# Altium schematic symbol library Diode - Rectifier.SchLib: 777 symbols (part 1 of 4) (continued)
## BAT42W-TP (continued)
DIODE SCHOTTKY 30V 200MA SOD123; Manufacturer: Micro Commercial Co; Current Reverse Leakage @ Vr: 500nA @ 25V; Reverse Recovery Time (trr): 5ns; Current Rectified: 200mA (DC); Voltage Forward (Vf): 1V @ 200mA; Part Number: BAT42W-TP; PartId: 29384; Supplier 1: Digi-Key; Supplier Part Number 1: BAT42WTPMSCT-ND; ComponentLink1Description: Datasheet; ComponentLink1URL: http://www.mccsemi.com/up_pdf/BAT42W-BAT43W(SOD-123).pdf; ComponentLink2Description: Digi-Key Listing; ComponentLink2URL: https://www.digikey.com/product-detail/en/micro-commercial-co/BAT42W-TP/BAT42WTPMSCT-ND/717337; Junction Operating Temperature: -55C ~ 125C; Price: 0.4; Type: Schottky; Device Package: SOD-123; Voltage DC Reverse (Vr): 30V
footprint SOD-123
pins: 1, 2

## BAT43W-7-F
designator D?
DIODE SCHOTTKY 30V 200MA SOD123; Manufacturer: Diodes Incorporated; Current Reverse Leakage @ Vr: 500nA @ 25V; Reverse Recovery Time (trr): 5ns; Current Rectified: 200mA (DC); Voltage Forward (Vf): 1V @ 200mA; Part Number: BAT43W-7-F; PartId: 14612; Supplier 1: Digi-Key; Supplier Part Number 1: BAT43W-FDITR-ND; ComponentLink1Description: Datasheet; ComponentLink1URL: //media.digikey.com/pdf/Data%20Sheets/Diodes%20PDFs/BAT42W%20-BAT43W.pdf; ComponentLink2Description: Digi-Key Listing; ComponentLink2URL: https://www.digikey.com/product-detail/en/diodes-incorporated/BAT43W-7-F/BAT43W-FDITR-ND/749953; Junction Operating Temperature: -55C ~ 125C; Price: 0.085; Type: Schottky; Device Package: SOD-123; Voltage DC Reverse (Vr): 30V
footprint SOD-123
pins: 1, 2

## BAT43W-TP
designator D?
DIODE SCHOTTKY 30V 200MA SOD123; Manufacturer: Micro Commercial Co; Current Reverse Leakage @ Vr: 500nA @ 25V; Reverse Recovery Time (trr): 5ns; Current Rectified: 200mA (DC); Voltage Forward (Vf): 1V @ 200mA; Part Number: BAT43W-TP; PartId: 29385; Supplier 1: Digi-Key; Supplier Part Number 1: BAT43WTPMSCT-ND; ComponentLink1Description: Datasheet; ComponentLink1URL: http://www.mccsemi.com/up_pdf/BAT42W-BAT43W(SOD-123).pdf; ComponentLink2Description: Digi-Key Listing; ComponentLink2URL: https://www.digikey.com/product-detail/en/micro-commercial-co/BAT43W-TP/BAT43WTPMSCT-ND/717339; Junction Operating Temperature: -55C ~ 125C; Price: 0.4; Type: Schottky; Device Package: SOD-123; Voltage DC Reverse (Vr): 30V
footprint SOD-123
pins: 1, 2

## BAT46W-7-F
designator D?
DIODE SCHOTTKY 100V 150MA SOD123; Manufacturer: Diodes Incorporated; Current Reverse Leakage @ Vr: 2uA @ 75V; Current Rectified: 150mA (DC); Voltage Forward (Vf): 450mV @ 10mA; Part Number: BAT46W-7-F; PartId: 14606; Supplier 1: Digi-Key; Supplier Part Number 1: BAT46W-7FDITR-ND; ComponentLink1Description: Datasheet; ComponentLink1URL: http://www.diodes.com/_files/datasheets/ds30044.pdf; ComponentLink2Description: Digi-Key Listing; ComponentLink2URL: https://www.digikey.com/product-detail/en/diodes-incorporated/BAT46W-7-F/BAT46W-7FDITR-ND/1934440; Junction Operating Temperature: -55C ~ 125C; Price: 0.081; Type: Schottky; Device Package: SOD-123; Voltage DC Reverse (Vr): 100V
footprint SOD-123
pins: 1, 2

## BAT46W-E3-08
designator D?
DIODE SCHOTTKY 100V 150MA SOD123; Manufacturer: Vishay Semiconductor Diodes Division; Current Reverse Leakage @ Vr: 5uA @ 75V; Current Rectified: 150mA (DC); Voltage Forward (Vf): 1V @ 250mA; Part Number: BAT46W-E3-08; PartId: 29348; Supplier 1: Digi-Key; Supplier Part Number 1: BAT46W-E3-08CT-ND; ComponentLink1Description: Datasheet; ComponentLink1URL: http://www.vishay.com/docs/85663/bat46wv.pdf; ComponentLink2Description: Digi-Key Listing; ComponentLink2URL: https://www.digikey.com/product-detail/en/vishay-semiconductor-diodes-division/BAT46W-E3-08/BAT46W-E3-08CT-ND/3104420; Junction Operating Temperature: 125C (Max); Price: 0.39; Type: Schottky; Device Package: SOD-123; Voltage DC Reverse (Vr): 100V
footprint SOD-123
pins: 1, 2

## BAT46W-E3-18
designator D?
DIODE SCHOTTKY 100V 150MA SOD123; Manufacturer: Vishay Semiconductor Diodes Division; Current Reverse Leakage @ Vr: 5uA @ 75V; Current Rectified: 150mA (DC); Voltage Forward (Vf): 1V @ 250mA; Part Number: BAT46W-E3-18; PartId: 29407; Supplier 1: Digi-Key; Supplier Part Number 1: BAT46W-E3-18GICT-ND; ComponentLink1Description: Datasheet; ComponentLink1URL: http://www.vishay.com/docs/85663/bat46wv.pdf; ComponentLink2Description: Digi-Key Listing; ComponentLink2URL: https://www.digikey.com/product-detail/en/vishay-semiconductor-diodes-division/BAT46W-E3-18/BAT46W-E3-18GICT-ND/6228425; Junction Operating Temperature: 125C (Max); Price: 0.39; Type: Schottky; Device Package: SOD-123; Voltage DC Reverse (Vr): 100V
footprint SOD-123
pins: 1, 2

## BAT46W-HE3-08
designator D?
DIODE SCHOTTKY 100V 150MA SOD123; Manufacturer: Vishay Semiconductor Diodes Division; Current Reverse Leakage @ Vr: 5uA @ 75V; Current Rectified: 150mA (DC); Voltage Forward (Vf): 1V @ 250mA; Part Number: BAT46W-HE3-08; PartId: 29409; Supplier 1: Digi-Key; Supplier Part Number 1: BAT46W-HE3-08GICT-ND; ComponentLink1Description: Datasheet; ComponentLink1URL: http://www.vishay.com/docs/85663/bat46wv.pdf; ComponentLink2Description: Digi-Key Listing; ComponentLink2URL: https://www.digikey.com/product-detail/en/vishay-semiconductor-diodes-division/BAT46W-HE3-08/BAT46W-HE3-08GICT-ND/6228455; Junction Operating Temperature: 125C (Max); Price: 0.41; Type: Schottky; Device Package: SOD-123; Voltage DC Reverse (Vr): 100V
footprint SOD-123
pins: 1, 2

## BAT46W-TP
designator D?
DIODE SCHOTTKY 100V 75MA SOD123; Manufacturer: Micro Commercial Co; Current Reverse Leakage @ Vr: 5uA @ 75V; Voltage Forward (Vf): 450mV @ 10mA; Part Number: BAT46W-TP; PartId: 29387; Supplier 1: Digi-Key; Supplier Part Number 1: BAT46W-TPMSCT-ND; ComponentLink1Description: Datasheet; ComponentLink1URL: http://www.mccsemi.com/up_pdf/BAT46W(SOD-123).pdf; ComponentLink2Description: Digi-Key Listing; ComponentLink2URL: https://www.digikey.com/product-detail/en/micro-commercial-co/BAT46W-TP/BAT46W-TPMSCT-ND/2345686; Junction Operating Temperature: -55C ~ 125C; Price: 0.4; Type: Schottky; Device Package: SOD-123; Voltage DC Reverse (Vr): 100V; Current Rectified: 75mA
footprint SOD-123
pins: 1, 2

## BAT46WH,115
designator D?
DIODE SCHOTTKY 100V 250MA; Manufacturer: NXP USA Inc.; Current Reverse Leakage @ Vr: 9uA @ 100V; Reverse Recovery Time (trr): 5.9ns; Current Rectified: 250mA (DC); Voltage Forward (Vf): 850mV @ 250mA; Part Number: BAT46WH,115; PartId: 29189; Supplier 1: Digi-Key; Supplier Part Number 1: 568-6016-1-ND; ComponentLink1Description: Datasheet; ComponentLink1URL: http://www.nxp.com/documents/data_sheet/BAT46WH.pdf; ComponentLink2Description: Digi-Key Listing; ComponentLink2URL: https://www.digikey.com/product-detail/en/nxp-usa-inc/BAT46WH,115/568-6016-1-ND/2531303; Junction Operating Temperature: 150C (Max); Price: 0.38; Type: Schottky; Device Package: SOD-123F; Voltage DC Reverse (Vr): 100V
footprint SOD123F
pins: 1, 2

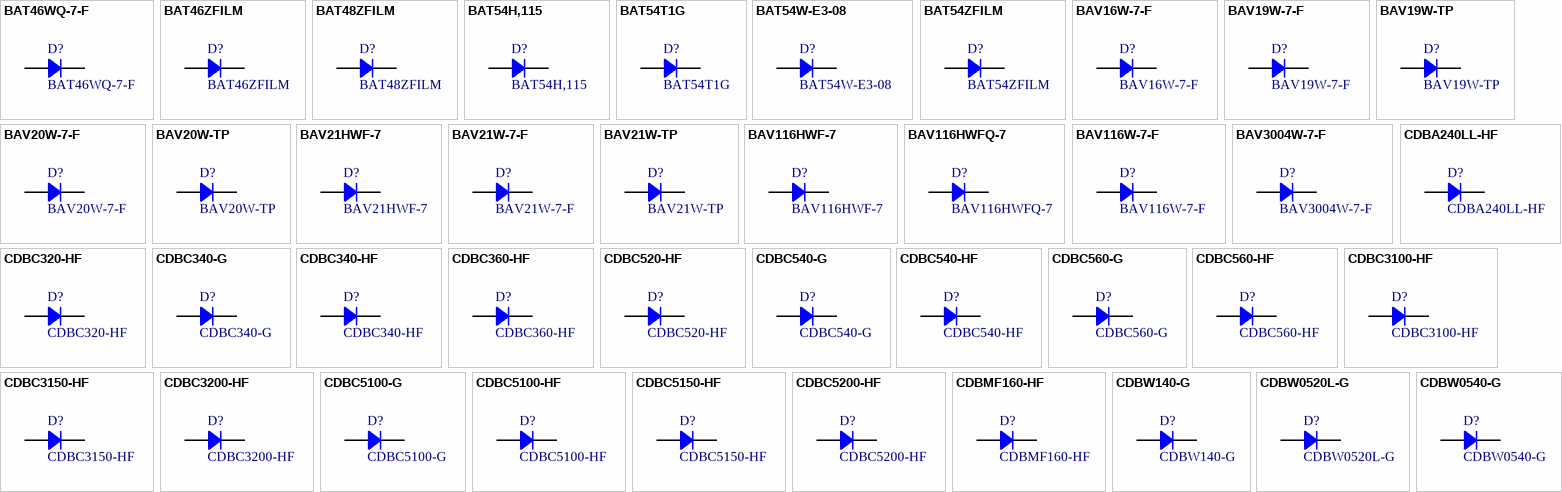
[diagram p3: symbols BAT46WQ-7-F to CDBW0540-G]

## BAT46WQ-7-F
designator D?
DIODE SCHOTTKY 100V SOD123; Manufacturer: Diodes Incorporated; Current Reverse Leakage @ Vr: 2uA @ 75V; Current Rectified: 150mA; Voltage Forward (Vf): 450mV @ 10mA; Part Number: BAT46WQ-7-F; PartId: 29436; Supplier 1: Digi-Key; Supplier Part Number 1: BAT46WQ-7-FDICT-ND; ComponentLink1Description: Datasheet; ComponentLink1URL: http://www.diodes.com/_files/datasheets/BAT46WQ.pdf; ComponentLink2Description: Digi-Key Listing; ComponentLink2URL: https://www.digikey.com/product-detail/en/diodes-incorporated/BAT46WQ-7-F/BAT46WQ-7-FDICT-ND/6003951; Junction Operating Temperature: -55C ~ 125C; Price: 0.37; Type: Schottky; Device Package: SOD-123; Voltage DC Reverse (Vr): 100V
footprint SOD-123
pins: 1, 2

## BAT46ZFILM
designator D?
DIODE SCHOTTKY 100V 150MA SOD123; Manufacturer: STMicroelectronics; Current Reverse Leakage @ Vr: 5uA @ 75V; Current Rectified: 150mA (DC); Voltage Forward (Vf): 1V @ 250mA; Part Number: BAT46ZFILM; PartId: 29342; Supplier 1: Digi-Key; Supplier Part Number 1: 497-5559-1-ND; ComponentLink1Description: Datasheet; ComponentLink1URL: http://www.st.com/content/ccc/resource/technical/document/datasheet/c6/32/d4/4a/28/d3/4b/11/CD00004930.pdf/files/CD00004930.pdf/jcr:content/translations/en.CD00004930.pdf; ComponentLink2Description: Digi-Key Listing; ComponentLink2URL: https://www.digikey.com/product-detail/en/stmicroelectronics/BAT46ZFILM/497-5559-1-ND/1207051; Junction Operating Temperature: 150C (Max); Price: 0.34; Type: Schottky; Device Package: SOD-123; Voltage DC Reverse (Vr): 100V
footprint SOD-123
pins: 1, 2

## BAT48ZFILM
designator D?
DIODE SCHOTTKY 40V 350MA SOD123; Manufacturer: STMicroelectronics; Current Reverse Leakage @ Vr: 25uA @ 40V; Current Rectified: 350mA (DC); Voltage Forward (Vf): 750mV @ 200mA; Part Number: BAT48ZFILM; PartId: 29394; Supplier 1: Digi-Key; Supplier Part Number 1: 497-5712-1-ND; ComponentLink1Description: Datasheet; ComponentLink1URL: http://www.st.com/content/ccc/resource/technical/document/datasheet/b2/2f/2a/0c/8b/b5/46/a3/CD00130229.pdf/files/CD00130229.pdf/jcr:content/translations/en.CD00130229.pdf; ComponentLink2Description: Digi-Key Listing; ComponentLink2URL: https://www.digikey.com/product-detail/en/stmicroelectronics/BAT48ZFILM/497-5712-1-ND/1299965; Junction Operating Temperature: -40C ~ 150C; Price: 0.43; Type: Schottky; Device Package: SOD-123; Voltage DC Reverse (Vr): 40V
footprint SOD-123
pins: 1, 2

## BAT54H,115
designator D?
DIODE SCHOTTKY 30V 200MA SOD123F; Manufacturer: NXP USA Inc.; Current Reverse Leakage @ Vr: 2uA @ 25V; Current Rectified: 200mA (DC); Voltage Forward (Vf): 800mV @ 100mA; Part Number: BAT54H,115; PartId: 29185; Supplier 1: Digi-Key; Supplier Part Number 1: 568-3415-1-ND; ComponentLink1Description: Datasheet; ComponentLink1URL: http://www.nxp.com/documents/data_sheet/BAT54H.pdf; ComponentLink2Description: Digi-Key Listing; ComponentLink2URL: https://www.digikey.com/product-detail/en/nxp-usa-inc/BAT54H,115/568-3415-1-ND/1127204; Junction Operating Temperature: 125C (Max); Price: 0.33; Type: Schottky; Device Package: SOD-123F; Voltage DC Reverse (Vr): 30V
footprint SOD123F
pins: 1, 2

## BAT54T1G
designator D?
DIODE SCHOTTKY 30V 200MA SOD123; Manufacturer: ON Semiconductor; Current Reverse Leakage @ Vr: 2uA @ 25V; Reverse Recovery Time (trr): 5ns; Current Rectified: 200mA (DC); Voltage Forward (Vf): 800mV @ 100mA; Part Number: BAT54T1G; PartId: 29374; Supplier 1: Digi-Key; Supplier Part Number 1: BAT54T1GOSCT-ND; ComponentLink1Description: Datasheet; ComponentLink1URL: http://www.onsemi.com/pub_link/Collateral/BAT54T1-D.PDF; ComponentLink2Description: Digi-Key Listing; ComponentLink2URL: https://www.digikey.com/product-detail/en/on-semiconductor/BAT54T1G/BAT54T1GOSCT-ND/917813; Junction Operating Temperature: -55C ~ 125C; Price: 0.34; Type: Schottky; Device Package: SOD-123; Voltage DC Reverse (Vr): 30V
footprint SOD-123
pins: 1, 2

## BAT54W-E3-08
designator D?
DIODE SCHOTTKY 30V 200MA SOD123; Manufacturer: Vishay Semiconductor Diodes Division; Current Reverse Leakage @ Vr: 2uA @ 25V; Reverse Recovery Time (trr): 5ns; Current Rectified: 200mA (DC); Voltage Forward (Vf): 800mV @ 100mA; Part Number: BAT54W-E3-08; PartId: 29386; Supplier 1: Digi-Key; Supplier Part Number 1: BAT54W-E3-08CT-ND; ComponentLink1Description: Datasheet; ComponentLink1URL: http://www.vishay.com/docs/85666/bat54w.pdf; ComponentLink2Description: Digi-Key Listing; ComponentLink2URL: https://www.digikey.com/product-detail/en/vishay-semiconductor-diodes-division/BAT54W-E3-08/BAT54W-E3-08CT-ND/3104427; Junction Operating Temperature: 125C (Max); Price: 0.38; Type: Schottky; Device Package: SOD-123; Voltage DC Reverse (Vr): 30V
footprint SOD-123
pins: 1, 2

## BAT54ZFILM
designator D?
DIODE SCHOTTKY 40V 300MA SOD123; Manufacturer: STMicroelectronics; Current Reverse Leakage @ Vr: 1uA @ 30V; Reverse Recovery Time (trr): 5ns; Current Rectified: 300mA (DC); Voltage Forward (Vf): 900mV @ 100mA; Part Number: BAT54ZFILM; PartId: 29377; Supplier 1: Digi-Key; Supplier Part Number 1: 497-5562-1-ND; ComponentLink1Description: Datasheet; ComponentLink1URL: http://www.st.com/content/ccc/resource/technical/document/datasheet/07/50/54/f2/0d/ba/4a/79/CD00001322.pdf/files/CD00001322.pdf/jcr:content/translations/en.CD00001322.pdf; ComponentLink2Description: Digi-Key Listing; ComponentLink2URL: https://www.digikey.com/product-detail/en/stmicroelectronics/BAT54ZFILM/497-5562-1-ND/1207054; Junction Operating Temperature: -40C ~ 150C; Price: 0.33; Type: Schottky; Device Package: SOD-123; Voltage DC Reverse (Vr): 40V
footprint SOD-123
pins: 1, 2

## BAV16W-7-F
designator D?
DIODE GEN PURP 100V 150MA SOD123; Manufacturer: Diodes Incorporated; Type: Standard; Current Reverse Leakage @ Vr: 1uA @ 75V; Reverse Recovery Time (trr): 4ns; Voltage Forward (Vf): 1.25V @ 150mA; Part Number: BAV16W-7-F; PartId: 14591; Supplier 1: Digi-Key; Supplier Part Number 1: BAV16W-FDITR-ND; ComponentLink1Description: Datasheet; ComponentLink1URL: http://www.diodes.com/_files/datasheets/ds30086.pdf; ComponentLink2Description: Digi-Key Listing; ComponentLink2URL: https://www.digikey.com/product-detail/en/diodes-incorporated/BAV16W-7-F/BAV16W-FDITR-ND/717706; Junction Operating Temperature: -65C ~ 150C; Price: 0.0331; Device Package: SOD-123; Voltage DC Reverse (Vr): 100V; Current Rectified: 150mA
footprint SOD-123
pins: 1, 2

## BAV19W-7-F
designator D?
DIODE GEN PURP 100V 200MA SOD123; Manufacturer: Diodes Incorporated; Type: Standard; Current Reverse Leakage @ Vr: 100nA @ 100V; Reverse Recovery Time (trr): 50ns; Voltage Forward (Vf): 1.25V @ 200mA; Part Number: BAV19W-7-F; PartId: 14593; Supplier 1: Digi-Key; Supplier Part Number 1: BAV19W-FDITR-ND; ComponentLink1Description: Datasheet; ComponentLink1URL: http://www.diodes.com/_files/datasheets/ds12024.pdf; ComponentLink2Description: Digi-Key Listing; ComponentLink2URL: https://www.digikey.com/product-detail/en/diodes-incorporated/BAV19W-7-F/BAV19W-FDITR-ND/717708; Junction Operating Temperature: -65C ~ 150C; Price: 0.046; Device Package: SOD-123; Voltage DC Reverse (Vr): 100V; Current Rectified: 200mA
footprint SOD-123
pins: 1, 2

## BAV19W-TP
designator D?
DIODE GEN PURP 100V 200MA SOD123; Manufacturer: Micro Commercial Co; Type: Standard; Current Reverse Leakage @ Vr: 100nA @ 100V; Reverse Recovery Time (trr): 50ns; Voltage Forward (Vf): 1.25V @ 200mA; Part Number: BAV19W-TP; PartId: 29359; Supplier 1: Digi-Key; Supplier Part Number 1: BAV19WTPMSCT-ND; ComponentLink1Description: Datasheet; ComponentLink1URL: http://www.mccsemi.com/up_pdf/BAV19W-BAV21W(SOD-123).pdf; ComponentLink2Description: Digi-Key Listing; ComponentLink2URL: https://www.digikey.com/product-detail/en/micro-commercial-co/BAV19W-TP/BAV19WTPMSCT-ND/717348; Junction Operating Temperature: -55C ~ 150C; Price: 0.21; Device Package: SOD-123; Voltage DC Reverse (Vr): 100V; Current Rectified: 200mA
footprint SOD-123
pins: 1, 2

## BAV20W-7-F
designator D?
DIODE GEN PURP 150V 200MA SOD123; Manufacturer: Diodes Incorporated; Type: Standard; Current Reverse Leakage @ Vr: 100nA @ 150V; Reverse Recovery Time (trr): 50ns; Voltage Forward (Vf): 1.25V @ 200mA; Part Number: BAV20W-7-F; PartId: 14594; Supplier 1: Digi-Key; Supplier Part Number 1: BAV20W-FDITR-ND; ComponentLink1Description: Datasheet; ComponentLink1URL: http://www.diodes.com/_files/datasheets/ds12024.pdf; ComponentLink2Description: Digi-Key Listing; ComponentLink2URL: https://www.digikey.com/product-detail/en/diodes-incorporated/BAV20W-7-F/BAV20W-FDITR-ND/749954; Junction Operating Temperature: -65C ~ 150C; Price: 0.046; Device Package: SOD-123; Voltage DC Reverse (Vr): 150V; Current Rectified: 200mA
footprint SOD-123
pins: 1, 2

## BAV20W-TP
designator D?
DIODE GEN PURP 150V 200MA SOD123; Manufacturer: Micro Commercial Co; Type: Standard; Current Reverse Leakage @ Vr: 100nA @ 150V; Reverse Recovery Time (trr): 50ns; Voltage Forward (Vf): 1.25V @ 200mA; Part Number: BAV20W-TP; PartId: 29417; Supplier 1: Digi-Key; Supplier Part Number 1: BAV20WTPMSCT-ND; ComponentLink1Description: Datasheet; ComponentLink1URL: http://www.mccsemi.com/up_pdf/BAV19W-BAV21W(SOD-123).pdf; ComponentLink2Description: Digi-Key Listing; ComponentLink2URL: https://www.digikey.com/product-detail/en/micro-commercial-co/BAV20W-TP/BAV20WTPMSCT-ND/717350; Junction Operating Temperature: -55C ~ 150C; Price: 0.21; Device Package: SOD-123; Voltage DC Reverse (Vr): 150V; Current Rectified: 200mA
footprint SOD-123
pins: 1, 2

## BAV21HWF-7
designator D?
DIODE SW 200V 200MA SOD123F; Manufacturer: Diodes Incorporated; Type: Standard; Current Reverse Leakage @ Vr: 100nA @ 200V; Reverse Recovery Time (trr): 50ns; Voltage Forward (Vf): 1.25V @ 200mA; Part Number: BAV21HWF-7; PartId: 29256; Supplier 1: Digi-Key; Supplier Part Number 1: BAV21HWF-7DICT-ND; ComponentLink1Description: Datasheet; ComponentLink1URL: http://www.diodes.com/_files/datasheets/BAV21HWF.pdf; ComponentLink2Description: Digi-Key Listing; ComponentLink2URL: https://www.digikey.com/product-detail/en/diodes-incorporated/BAV21HWF-7/BAV21HWF-7DICT-ND/5451809; Junction Operating Temperature: -65C ~ 150C; Price: 0.35; Device Package: SOD-123F; Voltage DC Reverse (Vr): 200V; Current Rectified: 200mA
footprint SOD123F
pins: 1, 2

## BAV21W-7-F
designator D?
DIODE GEN PURP 200V 200MA SOD123; Manufacturer: Diodes Incorporated; Type: Standard; Current Reverse Leakage @ Vr: 100nA @ 200V; Reverse Recovery Time (trr): 50ns; Voltage Forward (Vf): 1.25V @ 200mA; Part Number: BAV21W-7-F; PartId: 14590; Supplier 1: Digi-Key; Supplier Part Number 1: BAV21W-FDITR-ND; ComponentLink1Description: Datasheet; ComponentLink1URL: http://www.diodes.com/_files/datasheets/ds12024.pdf; ComponentLink2Description: Digi-Key Listing; ComponentLink2URL: https://www.digikey.com/product-detail/en/diodes-incorporated/BAV21W-7-F/BAV21W-FDITR-ND/717710; Junction Operating Temperature: -65C ~ 150C; Price: 0.0318; Device Package: SOD-123; Voltage DC Reverse (Vr): 200V; Current Rectified: 200mA
footprint SOD-123
pins: 1, 2

## BAV21W-TP
designator D?
DIODE GEN PURP 200V 200MA SOD123; Manufacturer: Micro Commercial Co; Type: Standard; Current Reverse Leakage @ Vr: 100nA @ 200V; Reverse Recovery Time (trr): 50ns; Voltage Forward (Vf): 1.25V @ 200mA; Part Number: BAV21W-TP; PartId: 29358; Supplier 1: Digi-Key; Supplier Part Number 1: BAV21WTPMSCT-ND; ComponentLink1Description: Datasheet; ComponentLink1URL: http://www.mccsemi.com/up_pdf/BAV19W-BAV21W(SOD-123).pdf; ComponentLink2Description: Digi-Key Listing; ComponentLink2URL: https://www.digikey.com/product-detail/en/micro-commercial-co/BAV21W-TP/BAV21WTPMSCT-ND/717352; Junction Operating Temperature: -55C ~ 150C; Price: 0.21; Device Package: SOD-123; Voltage DC Reverse (Vr): 200V; Current Rectified: 200mA
footprint SOD-123
pins: 1, 2

## BAV116HWF-7
designator D?
DIODE SW 130V 215MA SOD123F; Manufacturer: Diodes Incorporated; Type: Standard; Current Reverse Leakage @ Vr: 5nA @ 75V; Reverse Recovery Time (trr): 3us; Current Rectified: 215mA (DC); Voltage Forward (Vf): 1.25V @ 150mA; Part Number: BAV116HWF-7; PartId: 29255; Supplier 1: Digi-Key; Supplier Part Number 1: BAV116HWF-7DICT-ND; ComponentLink1Description: Datasheet; ComponentLink1URL: http://www.diodes.com/_files/datasheets/BAV116HWF.pdf; ComponentLink2Description: Digi-Key Listing; ComponentLink2URL: https://www.digikey.com/product-detail/en/diodes-incorporated/BAV116HWF-7/BAV116HWF-7DICT-ND/5451808; Junction Operating Temperature: -65C ~ 150C; Price: 0.34; Device Package: SOD-123F; Voltage DC Reverse (Vr): 130V
footprint SOD123F
pins: 1, 2

## BAV116HWFQ-7
designator D?
DIODE SW 85V 215MA SOD123F; Manufacturer: Diodes Incorporated; Type: Standard; Current Reverse Leakage @ Vr: 5nA @ 75V; Reverse Recovery Time (trr): 3us; Current Rectified: 215mA (DC); Voltage Forward (Vf): 1.25V @ 150mA; Part Number: BAV116HWFQ-7; PartId: 29279; Supplier 1: Digi-Key; Supplier Part Number 1: BAV116HWFQ-7DICT-ND; ComponentLink1Description: Datasheet; ComponentLink1URL: http://www.diodes.com/_files/datasheets/BAV116HWFQ.pdf; ComponentLink2Description: Digi-Key Listing; ComponentLink2URL: https://www.digikey.com/product-detail/en/diodes-incorporated/BAV116HWFQ-7/BAV116HWFQ-7DICT-ND/6012768; Junction Operating Temperature: -65C ~ 150C; Price: 0.42; Device Package: SOD-123F; Voltage DC Reverse (Vr): 85V
footprint SOD123F
pins: 1, 2

## BAV116W-7-F
designator D?
DIODE GEN PURP 130V 215MA SOD123; Manufacturer: Diodes Incorporated; Type: Standard; Current Reverse Leakage @ Vr: 5nA @ 75V; Reverse Recovery Time (trr): 3us; Current Rectified: 215mA (DC); Voltage Forward (Vf): 1.25V @ 150mA; Part Number: BAV116W-7-F; PartId: 14592; Supplier 1: Digi-Key; Supplier Part Number 1: BAV116W-FDITR-ND; ComponentLink1Description: Datasheet; ComponentLink1URL: http://www.diodes.com/_files/datasheets/ds30291.pdf; ComponentLink2Description: Digi-Key Listing; ComponentLink2URL: https://www.digikey.com/product-detail/en/diodes-incorporated/BAV116W-7-F/BAV116W-FDITR-ND/717705; Junction Operating Temperature: -65C ~ 150C; Price: 0.046; Device Package: SOD-123; Voltage DC Reverse (Vr): 130V
footprint SOD-123
pins: 1, 2

## BAV3004W-7-F
designator D?
DIODE GEN PURP 300V 225MA SOD123; Manufacturer: Diodes Incorporated; Type: Standard; Current Reverse Leakage @ Vr: 100nA @ 240V; Reverse Recovery Time (trr): 50ns; Current Rectified: 225mA (DC); Voltage Forward (Vf): 1.25V @ 200mA; Part Number: BAV3004W-7-F; PartId: 14598; Supplier 1: Digi-Key; Supplier Part Number 1: BAV3004W-FDITR-ND; ComponentLink1Description: Datasheet; ComponentLink1URL: http://www.diodes.com/_files/datasheets/ds30371.pdf; ComponentLink2Description: Digi-Key Listing; ComponentLink2URL: https://www.digikey.com/product-detail/en/diodes-incorporated/BAV3004W-7-F/BAV3004W-FDITR-ND/815036; Junction Operating Temperature: -65C ~ 150C; Price: 0.06; Device Package: SOD-123; Voltage DC Reverse (Vr): 300V
footprint SOD-123
pins: 1, 2

## CDBA240LL-HF
designator D?
DIODE SCHOTTKY 40V 2A DO214AC; Manufacturer: Comchip Technology; Type: Surface Mount; Current Reverse Leakage @ Vr: 1mA @ 40V; Current Rectified: 2A (DC); Voltage Forward (Vf): 350mV @ 2A; Part Number: CDBA240LL-HF; PartId: 7127; Supplier 1: Digi-Key; Supplier Part Number 1: 641-1698-2-ND; ComponentLink1Description: Datasheet; ComponentLink1URL: http://www.comchiptech.com/cms/UserFiles/CDBA240LL-HF%20RevC514247.pdf; ComponentLink2Description: Digi-Key Listing; ComponentLink2URL: http://www.digikey.ca/product-detail/en/CDBA240LL-HF/641-1698-2-ND/3308134; Junction Operating Temperature: -55C ~ 100C; Price: 0.2225; Device Package: DO-214AC, SMA; Reverse Recovery Time (trr): -; Voltage DC Reverse (Vr): 40V
footprint DO214AC SMA
pins: 1, 2

## CDBC320-HF
designator D?
DIODE SCHOTTKY 20V 3A DO214AB; Manufacturer: Comchip Technology; Current Reverse Leakage @ Vr: 500uA @ 20V; Voltage Forward (Vf): 450mV @ 3A; Part Number: CDBC320-HF; PartId: 27841; Supplier 1: Digi-Key; Supplier Part Number 1: 641-1726-1-ND; ComponentLink1Description: Datasheet; ComponentLink1URL: http://www.comchiptech.com/cms/UserFiles/CDBC320-HF%20Thru665433.%20CDBC3100-HF%20RevA.PDF; ComponentLink2Description: Digi-Key Listing; ComponentLink2URL: https://www.digikey.com/product-detail/en/comchip-technology/CDBC320-HF/641-1726-1-ND/5226109; Junction Operating Temperature: -50C ~ 150C; Price: 0.55; Type: Schottky; Device Package: DO-214AB, SMC; Voltage DC Reverse (Vr): 20V; Current Rectified: 3A
footprint ST DO214AB SMC
pins: 1, 2

## CDBC340-G
designator D?
DIODE SCHOTTKY 40V 3A DO214AB; Manufacturer: Comchip Technology; Current Reverse Leakage @ Vr: 500uA @ 40V; Voltage Forward (Vf): 500mV @ 3A; Part Number: CDBC340-G; PartId: 27723; Supplier 1: Digi-Key; Supplier Part Number 1: 641-1121-1-ND; ComponentLink1Description: Datasheet; ComponentLink1URL: http://www.comchiptech.com/cms/UserFiles/CDBC320-G%20Thru936871.%20CDBC3100-G%20RevB.pdf; ComponentLink2Description: Digi-Key Listing; ComponentLink2URL: https://www.digikey.com/product-detail/en/comchip-technology/CDBC340-G/641-1121-1-ND/1559082; Junction Operating Temperature: 125C (Max); Price: 0.46; Type: Schottky; Device Package: DO-214AB, SMC; Voltage DC Reverse (Vr): 40V; Current Rectified: 3A
footprint ST DO214AB SMC
pins: 1, 2

## CDBC340-HF
designator D?
DIODE SCHOTTKY 40V 3A DO214AB; Manufacturer: Comchip Technology; Current Reverse Leakage @ Vr: 500uA @ 40V; Voltage Forward (Vf): 500mV @ 3A; Part Number: CDBC340-HF; PartId: 27843; Supplier 1: Digi-Key; Supplier Part Number 1: 641-1727-1-ND; ComponentLink1Description: Datasheet; ComponentLink1URL: http://www.comchiptech.com/cms/UserFiles/CDBC320-HF%20Thru665433.%20CDBC3100-HF%20RevA.PDF; ComponentLink2Description: Digi-Key Listing; ComponentLink2URL: https://www.digikey.com/product-detail/en/comchip-technology/CDBC340-HF/641-1727-1-ND/5226110; Junction Operating Temperature: -50C ~ 150C; Price: 0.56; Type: Schottky; Device Package: DO-214AB, SMC; Voltage DC Reverse (Vr): 40V; Current Rectified: 3A
footprint ST DO214AB SMC
pins: 1, 2

## CDBC360-HF
designator D?
DIODE SCHOTTKY 60V 3A DO214AB; Manufacturer: Comchip Technology; Current Reverse Leakage @ Vr: 500uA @ 60V; Voltage Forward (Vf): 700mV @ 3A; Part Number: CDBC360-HF; PartId: 27798; Supplier 1: Digi-Key; Supplier Part Number 1: 641-1728-1-ND; ComponentLink1Description: Datasheet; ComponentLink1URL: http://www.comchiptech.com/cms/UserFiles/CDBC320-HF%20Thru665433.%20CDBC3100-HF%20RevA.PDF; ComponentLink2Description: Digi-Key Listing; ComponentLink2URL: https://www.digikey.com/product-detail/en/comchip-technology/CDBC360-HF/641-1728-1-ND/5226111; Junction Operating Temperature: -50C ~ 150C; Price: 0.56; Type: Schottky; Device Package: DO-214AB, SMC; Voltage DC Reverse (Vr): 60V; Current Rectified: 3A
footprint ST DO214AB SMC
pins: 1, 2

## CDBC520-HF
designator D?
DIODE SCHOTTKY 20V 5A DO214AB; Manufacturer: Comchip Technology; Current Reverse Leakage @ Vr: 500uA @ 20V; Voltage Forward (Vf): 500mV @ 5A; Part Number: CDBC520-HF; PartId: 27844; Supplier 1: Digi-Key; Supplier Part Number 1: 641-1732-1-ND; ComponentLink1Description: Datasheet; ComponentLink1URL: http://www.comchiptech.com/cms/UserFiles/CDBC520-HF%20Thru195419.%20CDBC5100-HF%20RevB.pdf; ComponentLink2Description: Digi-Key Listing; ComponentLink2URL: https://www.digikey.com/product-detail/en/comchip-technology/CDBC520-HF/641-1732-1-ND/5226115; Junction Operating Temperature: -50C ~ 175C; Price: 0.56; Type: Schottky; Device Package: DO-214AB, SMC; Voltage DC Reverse (Vr): 20V; Current Rectified: 5A
footprint ST DO214AB SMC
pins: 1, 2

## CDBC540-G
designator D?
DIODE SCHOTTKY 40V 5A DO214AB; Manufacturer: Comchip Technology; Current Reverse Leakage @ Vr: 500uA @ 40V; Voltage Forward (Vf): 550mV @ 5A; Part Number: CDBC540-G; PartId: 27690; Supplier 1: Digi-Key; Supplier Part Number 1: 641-1126-1-ND; ComponentLink1Description: Datasheet; ComponentLink1URL: http://www.comchiptech.com/cms/UserFiles/CDBC520-G%20Thru936981.%20CDBC5100-G%20RevC.pdf; ComponentLink2Description: Digi-Key Listing; ComponentLink2URL: https://www.digikey.com/product-detail/en/comchip-technology/CDBC540-G/641-1126-1-ND/1559087; Junction Operating Temperature: -40C ~ 125C; Price: 0.66; Type: Schottky; Device Package: DO-214AB, SMC; Voltage DC Reverse (Vr): 40V; Current Rectified: 5A
footprint ST DO214AB SMC
pins: 1, 2

## CDBC540-HF
designator D?
DIODE SCHOTTKY 40V 5A DO214AB; Manufacturer: Comchip Technology; Current Reverse Leakage @ Vr: 500uA @ 40V; Voltage Forward (Vf): 550mV @ 5A; Part Number: CDBC540-HF; PartId: 27751; Supplier 1: Digi-Key; Supplier Part Number 1: 641-1733-1-ND; ComponentLink1Description: Datasheet; ComponentLink1URL: http://www.comchiptech.com/cms/UserFiles/CDBC520-HF%20Thru195419.%20CDBC5100-HF%20RevB.pdf; ComponentLink2Description: Digi-Key Listing; ComponentLink2URL: https://www.digikey.com/product-detail/en/comchip-technology/CDBC540-HF/641-1733-1-ND/5226116; Junction Operating Temperature: -50C ~ 150C; Price: 0.74; Type: Schottky; Device Package: DO-214AB, SMC; Voltage DC Reverse (Vr): 40V; Current Rectified: 5A
footprint ST DO214AB SMC
pins: 1, 2

## CDBC560-G
designator D?
DIODE SCHOTTKY 60V 5A DO214AB; Manufacturer: Comchip Technology; Current Reverse Leakage @ Vr: 500uA @ 60V; Voltage Forward (Vf): 750mV @ 5A; Part Number: CDBC560-G; PartId: 27697; Supplier 1: Digi-Key; Supplier Part Number 1: 641-1127-1-ND; ComponentLink1Description: Datasheet; ComponentLink1URL: http://www.comchiptech.com/cms/UserFiles/CDBC520-G%20Thru936981.%20CDBC5100-G%20RevC.pdf; ComponentLink2Description: Digi-Key Listing; ComponentLink2URL: https://www.digikey.com/product-detail/en/comchip-technology/CDBC560-G/641-1127-1-ND/1559088; Junction Operating Temperature: -40C ~ 125C; Price: 0.74; Type: Schottky; Device Package: DO-214AB, SMC; Voltage DC Reverse (Vr): 60V; Current Rectified: 5A
footprint ST DO214AB SMC
pins: 1, 2

## CDBC560-HF
designator D?
DIODE SCHOTTKY 60V 5A DO214AB; Manufacturer: Comchip Technology; Current Reverse Leakage @ Vr: 500uA @ 60V; Voltage Forward (Vf): 750mV @ 5A; Part Number: CDBC560-HF; PartId: 27753; Supplier 1: Digi-Key; Supplier Part Number 1: 641-1734-1-ND; ComponentLink1Description: Datasheet; ComponentLink1URL: http://www.comchiptech.com/cms/UserFiles/CDBC520-HF%20Thru195419.%20CDBC5100-HF%20RevB.pdf; ComponentLink2Description: Digi-Key Listing; ComponentLink2URL: https://www.digikey.com/product-detail/en/comchip-technology/CDBC560-HF/641-1734-1-ND/5226117; Junction Operating Temperature: -50C ~ 150C; Price: 0.76; Type: Schottky; Device Package: DO-214AB, SMC; Voltage DC Reverse (Vr): 60V; Current Rectified: 5A
footprint ST DO214AB SMC
pins: 1, 2

## CDBC3100-HF
designator D?
DIODE SCHOTTKY 100V 3A DO214AB; Manufacturer: Comchip Technology; Current Reverse Leakage @ Vr: 500uA @ 100V; Voltage Forward (Vf): 810mV @ 3A; Part Number: CDBC3100-HF; PartId: 27832; Supplier 1: Digi-Key; Supplier Part Number 1: 641-1672-1-ND; ComponentLink1Description: Datasheet; ComponentLink1URL: http://www.comchiptech.com/cms/UserFiles/CDBC320-HF%20Thru665433.%20CDBC3100-HF%20RevA.PDF; ComponentLink2Description: Digi-Key Listing; ComponentLink2URL: https://www.digikey.com/product-detail/en/comchip-technology/CDBC3100-HF/641-1672-1-ND/5147309; Junction Operating Temperature: -50C ~ 150C; Price: 0.51; Type: Schottky; Device Package: DO-214AB, SMC; Voltage DC Reverse (Vr): 100V; Current Rectified: 3A
footprint ST DO214AB SMC
pins: 1, 2

## CDBC3150-HF
designator D?
DIODE SCHOTTKY 150V 3A DO214AB; Manufacturer: Comchip Technology; Current Reverse Leakage @ Vr: 500uA @ 150V; Voltage Forward (Vf): 870mV @ 3A; Part Number: CDBC3150-HF; PartId: 27839; Supplier 1: Digi-Key; Supplier Part Number 1: 641-1724-1-ND; ComponentLink1Description: Datasheet; ComponentLink1URL: http://www.comchiptech.com/cms/UserFiles/CDBC3150-HF%20Thru665657.%20CDBC3200-HF%20RevA.pdf; ComponentLink2Description: Digi-Key Listing; ComponentLink2URL: https://www.digikey.com/product-detail/en/comchip-technology/CDBC3150-HF/641-1724-1-ND/5226107; Junction Operating Temperature: -50C ~ 175C; Price: 0.54; Type: Schottky; Device Package: DO-214AB, SMC; Voltage DC Reverse (Vr): 150V; Current Rectified: 3A
footprint ST DO214AB SMC
pins: 1, 2

## CDBC3200-HF
designator D?
DIODE SCHOTTKY 200V 3A DO214AB; Manufacturer: Comchip Technology; Current Reverse Leakage @ Vr: 500uA @ 200V; Voltage Forward (Vf): 900mV @ 3A; Part Number: CDBC3200-HF; PartId: 27842; Supplier 1: Digi-Key; Supplier Part Number 1: 641-1725-1-ND; ComponentLink1Description: Datasheet; ComponentLink1URL: http://www.comchiptech.com/cms/UserFiles/CDBC3150-HF%20Thru665657.%20CDBC3200-HF%20RevA.pdf; ComponentLink2Description: Digi-Key Listing; ComponentLink2URL: https://www.digikey.com/product-detail/en/comchip-technology/CDBC3200-HF/641-1725-1-ND/5226108; Junction Operating Temperature: -50C ~ 175C; Price: 0.56; Type: Schottky; Device Package: DO-214AB, SMC; Voltage DC Reverse (Vr): 200V; Current Rectified: 3A
footprint ST DO214AB SMC
pins: 1, 2

## CDBC5100-G
designator D?
DIODE SCHOTTKY 100V 5A DO214AB; Manufacturer: Comchip Technology; Current Reverse Leakage @ Vr: 500uA @ 100V; Voltage Forward (Vf): 850mV @ 5A; Part Number: CDBC5100-G; PartId: 27698; Supplier 1: Digi-Key; Supplier Part Number 1: 641-1124-1-ND; ComponentLink1Description: Datasheet; ComponentLink1URL: http://www.comchiptech.com/cms/UserFiles/CDBC520-G%20Thru936981.%20CDBC5100-G%20RevC.pdf; ComponentLink2Description: Digi-Key Listing; ComponentLink2URL: https://www.digikey.com/product-detail/en/comchip-technology/CDBC5100-G/641-1124-1-ND/1559085; Junction Operating Temperature: 125C (Max); Price: 0.74; Type: Schottky; Device Package: DO-214AB, SMC; Voltage DC Reverse (Vr): 100V; Current Rectified: 5A
footprint ST DO214AB SMC
pins: 1, 2

## CDBC5100-HF
designator D?
DIODE SCHOTTKY 100V 5A DO214AB; Manufacturer: Comchip Technology; Current Reverse Leakage @ Vr: 500uA @ 100V; Voltage Forward (Vf): 810mV @ 5A; Part Number: CDBC5100-HF; PartId: 27699; Supplier 1: Digi-Key; Supplier Part Number 1: 641-1729-1-ND; ComponentLink1Description: Datasheet; ComponentLink1URL: http://www.comchiptech.com/cms/UserFiles/CDBC520-HF%20Thru195419.%20CDBC5100-HF%20RevB.pdf; ComponentLink2Description: Digi-Key Listing; ComponentLink2URL: https://www.digikey.com/product-detail/en/comchip-technology/CDBC5100-HF/641-1729-1-ND/5226112; Junction Operating Temperature: -50C ~ 150C; Price: 0.74; Type: Schottky; Device Package: DO-214AB, SMC; Voltage DC Reverse (Vr): 100V; Current Rectified: 5A
footprint ST DO214AB SMC
pins: 1, 2

## CDBC5150-HF
designator D?
DIODE SCHOTTKY 150V 5A DO214AB; Manufacturer: Comchip Technology; Current Reverse Leakage @ Vr: 500uA @ 150V; Voltage Forward (Vf): 870mV @ 5A; Part Number: CDBC5150-HF; PartId: 27858; Supplier 1: Digi-Key; Supplier Part Number 1: 641-1730-1-ND; ComponentLink1Description: Datasheet; ComponentLink1URL: http://www.comchiptech.com/cms/UserFiles/CDBC5150-HF%20Thru913245.%20CDBC5200-HF%20RevB.pdf; ComponentLink2Description: Digi-Key Listing; ComponentLink2URL: https://www.digikey.com/product-detail/en/comchip-technology/CDBC5150-HF/641-1730-1-ND/5226113; Junction Operating Temperature: -50C ~ 175C; Price: 0.68; Type: Schottky; Device Package: DO-214AB, SMC; Voltage DC Reverse (Vr): 150V; Current Rectified: 5A
footprint ST DO214AB SMC
pins: 1, 2

## CDBC5200-HF
designator D?
DIODE SCHOTTKY 200V 5A DO214AB; Manufacturer: Comchip Technology; Current Reverse Leakage @ Vr: 500uA @ 150V; Voltage Forward (Vf): 900mV @ 5A; Part Number: CDBC5200-HF; PartId: 27849; Supplier 1: Digi-Key; Supplier Part Number 1: 641-1731-1-ND; ComponentLink1Description: Datasheet; ComponentLink1URL: http://www.comchiptech.com/cms/UserFiles/CDBC5150-HF%20Thru913245.%20CDBC5200-HF%20RevB.pdf; ComponentLink2Description: Digi-Key Listing; ComponentLink2URL: https://www.digikey.com/product-detail/en/comchip-technology/CDBC5200-HF/641-1731-1-ND/5226114; Junction Operating Temperature: -50C ~ 175C; Price: 0.62; Type: Schottky; Device Package: DO-214AB, SMC; Voltage DC Reverse (Vr): 200V; Current Rectified: 5A
footprint ST DO214AB SMC
pins: 1, 2

## CDBMF160-HF
designator D?
DIODE SCHOTTKY 60V 1A SOD123FL; Manufacturer: Comchip Technology; Current Reverse Leakage @ Vr: 100uA @ 60V; Voltage Forward (Vf): 700mV @ 1A; Part Number: CDBMF160-HF; PartId: 29325; Supplier 1: Digi-Key; Supplier Part Number 1: 641-1785-1-ND; ComponentLink1Description: Datasheet; ComponentLink1URL: http://www.comchiptech.com/cms/UserFiles/CDBMF160-HF%20RevA639050.pdf; ComponentLink2Description: Digi-Key Listing; ComponentLink2URL: https://www.digikey.com/product-detail/en/comchip-technology/CDBMF160-HF/641-1785-1-ND/6138949; Junction Operating Temperature: -40C ~ 125C; Price: 0.4; Type: Schottky; Device Package: SOD-123F; Voltage DC Reverse (Vr): 60V; Current Rectified: 1A
footprint SOD123F
pins: 1, 2

## CDBW140-G
designator D?
DIODE SCHOTTKY 40V 1A SOD123; Manufacturer: Comchip Technology; Current Reverse Leakage @ Vr: 1mA @ 40V; Voltage Forward (Vf): 600mV @ 1A; Part Number: CDBW140-G; PartId: 29380; Supplier 1: Digi-Key; Supplier Part Number 1: 641-1458-1-ND; ComponentLink1Description: Datasheet; ComponentLink1URL: http://www.comchiptech.com/cms/UserFiles/CDBW120-G%20Thru.%20CDBW140-G%20RevE.pdf; ComponentLink2Description: Digi-Key Listing; ComponentLink2URL: https://www.digikey.com/product-detail/en/comchip-technology/CDBW140-G/641-1458-1-ND/3511543; Junction Operating Temperature: 125C (Max); Price: 0.39; Type: Schottky; Device Package: SOD-123; Voltage DC Reverse (Vr): 40V; Current Rectified: 1A
footprint SOD-123
pins: 1, 2

## CDBW0520L-G
designator D?
DIODE SCHOTTKY 20V 500MA SOD123; Manufacturer: Comchip Technology; Current Reverse Leakage @ Vr: 250uA @ 20V; Voltage Forward (Vf): 385mV @ 500mA; Part Number: CDBW0520L-G; PartId: 29431; Supplier 1: Digi-Key; Supplier Part Number 1: 641-1326-1-ND; ComponentLink1Description: Datasheet; ComponentLink1URL: http://www.comchiptech.com/cms/UserFiles/CDBW0520L-G%20Thru541455.%20CDBW0540-G%20RevB.pdf; ComponentLink2Description: Digi-Key Listing; ComponentLink2URL: https://www.digikey.com/product-detail/en/comchip-technology/CDBW0520L-G/641-1326-1-ND/1979691; Junction Operating Temperature: 125C (Max); Price: 0.44; Type: Schottky; Device Package: SOD-123; Voltage DC Reverse (Vr): 20V; Current Rectified: 500mA
footprint SOD-123
pins: 1, 2

## CDBW0540-G
designator D?
DIODE SCHOTTKY 40V 500MA SOD123; Manufacturer: Comchip Technology; Current Reverse Leakage @ Vr: 20uA @ 40V; Voltage Forward (Vf): 510mV @ 500mA; Part Number: CDBW0540-G; PartId: 29430; Supplier 1: Digi-Key; Supplier Part Number 1: 641-1327-1-ND; ComponentLink1Description: Datasheet; ComponentLink1URL: http://www.comchiptech.com/cms/UserFiles/CDBW0520L-G%20Thru541455.%20CDBW0540-G%20RevB.pdf; ComponentLink2Description: Digi-Key Listing; ComponentLink2URL: https://www.digikey.com/product-detail/en/comchip-technology/CDBW0540-G/641-1327-1-ND/1979692; Junction Operating Temperature: 125C (Max); Price: 0.44; Type: Schottky; Device Package: SOD-123; Voltage DC Reverse (Vr): 40V; Current Rectified: 500mA
footprint SOD-123
pins: 1, 2

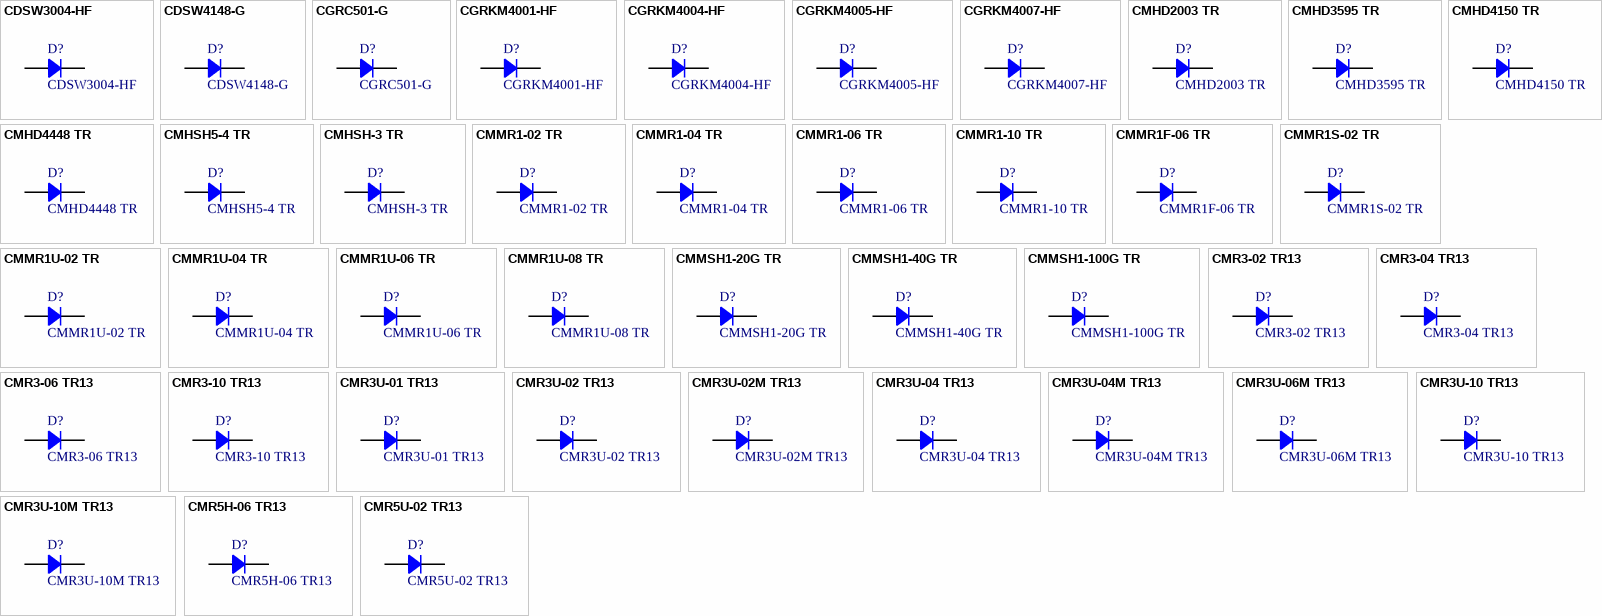
[diagram p4: symbols CDSW3004-HF to CMR5U-02 TR13]

## CDSW3004-HF
designator D?
DIODE GEN PURP 300V 225MA SOD123; Manufacturer: Comchip Technology; Type: Standard; Current Reverse Leakage @ Vr: 100nA @ 240V; Reverse Recovery Time (trr): 50ns; Voltage Forward (Vf): 1.25V @ 200mA; Part Number: CDSW3004-HF; PartId: 29411; Supplier 1: Digi-Key; Supplier Part Number 1: 641-1788-1-ND; ComponentLink1Description: Datasheet; ComponentLink1URL: http://www.comchiptech.com/cms/UserFiles/CDSW3004-HF%20RevA679419.pdf; ComponentLink2Description: Digi-Key Listing; ComponentLink2URL: https://www.digikey.com/product-detail/en/comchip-technology/CDSW3004-HF/641-1788-1-ND/6138952; Junction Operating Temperature: -65C ~ 150C; Price: 0.5; Device Package: SOD-123; Voltage DC Reverse (Vr): 300V; Current Rectified: 225mA
footprint SOD-123
pins: 1, 2

## CDSW4148-G
designator D?
DIODE GEN PURP 75V 150MA SOD123; Manufacturer: Comchip Technology; Type: Standard; Current Reverse Leakage @ Vr: 1uA @ 75V; Reverse Recovery Time (trr): 4ns; Voltage Forward (Vf): 1.25V @ 150mA; Part Number: CDSW4148-G; PartId: 29399; Supplier 1: Digi-Key; Supplier Part Number 1: 641-1459-1-ND; ComponentLink1Description: Datasheet; ComponentLink1URL: http://www.comchiptech.com/cms/UserFiles/CDSW4148-G%20RevG570196.pdf; ComponentLink2Description: Digi-Key Listing; ComponentLink2URL: https://www.digikey.com/product-detail/en/comchip-technology/CDSW4148-G/641-1459-1-ND/3511544; Junction Operating Temperature: -65C ~ 150C; Price: 0.2; Device Package: SOD-123; Voltage DC Reverse (Vr): 75V; Current Rectified: 150mA
footprint SOD-123
pins: 1, 2

## CGRC501-G
designator D?